# Altium footprint library TarabusLib_KOR.PcbLib: 560 footprints (part 3 of 35)
Each footprint in its own frame and in the unit in brackets; x right, y up, seen from the top. Pads: shape width x height; smd on the part's side, far side on the other; paste and mask are expansions set on the pad; w line width, h text height; cw(c..) or ccw(c..) is an arc to the next point about the centre after c.
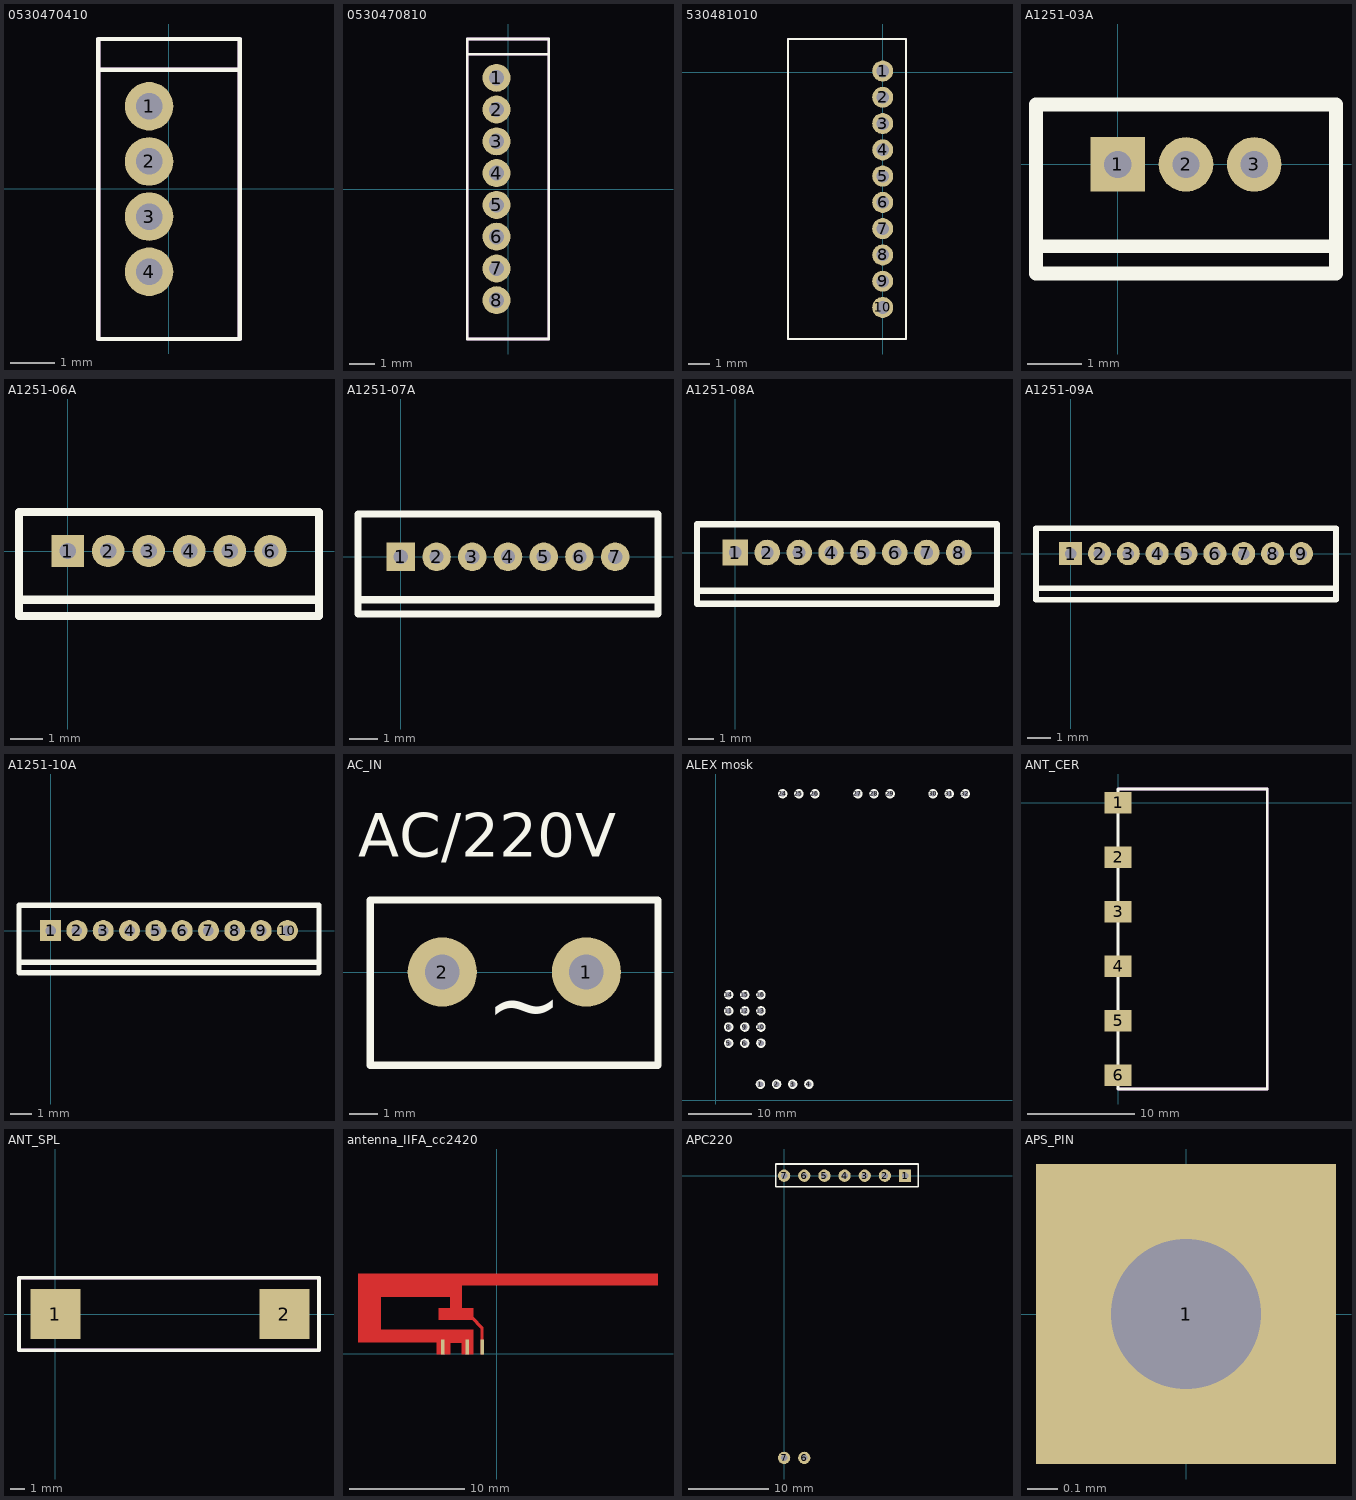
[diagram p2: the footprints below, top view; thin cyan lines are the x and y axes]

## 0530470410 [mm]
pads (4):
  round 1.1 hole 0.6 mask+0: 1(-0.45,1.875) 2(-0.45,0.625) 3(-0.45,-0.625) 4(-0.45,-1.875)
Top Overlay:
  lines w0.1: -1.6,2.7 1.6,2.7 ; -1.6,-3.4 1.6,-3.4 1.6,3.4 -1.6,3.4 -1.6,-3.4
Mechanical 7:
  lines w0.1: -1.6,2.7 1.6,2.7 ; -1.6,-3.4 -1.6,3.4 1.6,3.4 1.6,-3.4 -1.6,-3.4
3D body "530470410.stp": height 4.1, standoff -2.3, extent -1.6,-3.375 1.6,3.375

## 0530470810 [mm]
pads (8):
  round 1.1 hole 0.6 mask+0: 1(-0.45,4.375) 2(-0.45,3.125) 3(-0.45,1.875) 4(-0.45,0.625) 5(-0.45,-0.625) 6(-0.45,-1.875) 7(-0.45,-3.125) 8(-0.45,-4.375)
Top Overlay:
  lines w0.1: -1.6,5.3 1.6,5.3 ; -1.6,-5.9 1.6,-5.9 1.6,5.9 -1.6,5.9 -1.6,-5.9
Mechanical 7:
  lines w0.1: -1.6,5.3 1.6,5.3 ; -1.6,-5.9 -1.6,5.9 1.6,5.9 1.6,-5.9 -1.6,-5.9
3D body "530470810.stp": height 4.1, standoff -2.3, extent -1.6,-5.875 1.6,5.875

## 530481010 [mm]
pads (10):
  round 1 hole 0.6 mask+0: 1(0,0.05) 2(0,-1.2) 3(0,-2.45) 4(0,-3.7) 5(0,-4.95) 6(0,-6.2) 7(0,-7.45) 8(0,-8.7) 9(0,-9.95) 10(0,-11.2)
Top Overlay:
  lines w0.1: -4.5,-12.7 -4.5,1.575 1.1,1.575 1.1,-12.7 -4.5,-12.7
Mechanical 7:
  lines w0.1: -4.5,-12.7 1.1,-12.7 1.1,1.575 -4.5,1.575 -4.5,-12.7
3D body "5738.stp": height 3.55, standoff -2.25, extent -4.45,-12.625 1.05,1.625

## A1251-03A [mm]
pads (3):
  rect 1x1 hole 0.5 mask+0: 1(0,0)
  round 1 hole 0.5 mask+0: 2(1.25,0) 3(2.5,0)
Top Overlay:
  lines w0.254: -1.5,-1.5 4,-1.5 ; -1.5,-2 -1.5,1.1 4,1.1 4,-2 -1.5,-2
3D body "530470310.stp": height 4.1, standoff -2.3, extent -1.5,-2.1 4,1.1

## A1251-06A [mm]
pads (6):
  rect 1x1 hole 0.5 mask+0: 1(0,0)
  round 1 hole 0.5 mask+0: 2(1.25,0) 3(2.5,0) 4(3.75,0) 5(5,0) 6(6.25,0)
Top Overlay:
  lines w0.254: -1.5,-1.5 7.75,-1.5 ; -1.5,-2 -1.5,1.2 7.75,1.2 7.75,-2 -1.5,-2
3D body "530470610.stp": height 4.1, standoff -2.3, extent -1.425,-2.1 7.825,1.1

## A1251-07A [mm]
pads (7):
  rect 1x1 hole 0.5 mask+0: 1(0,0)
  round 1 hole 0.5 mask+0: 2(1.25,0) 3(2.5,0) 4(3.75,0) 5(5,0) 6(6.25,0) 7(7.5,0)
Top Overlay:
  lines w0.254: -1.5,-1.5 9,-1.5 ; -1.5,-2 -1.5,1.5 9,1.5 9,-2 -1.5,-2
3D body: height 8, standoff 0, extent -1.5,-2 9,1.5

## A1251-08A [mm]
pads (8):
  rect 1x1 hole 0.5 mask+0: 1(0,0)
  round 1 hole 0.5 mask+0: 2(1.25,0) 3(2.5,0) 4(3.75,0) 5(5,0) 6(6.25,0) 7(7.5,0) 8(8.75,0)
Top Overlay:
  lines w0.254: -1.5,-1.5 10.2,-1.5 ; -1.5,-2 10.25,-2 10.25,1.1 -1.5,1.1 -1.5,-2
3D body "530470810.stp": height 4.1, standoff -2.3, extent -1.475,-2.1 10.275,1.1

## A1251-09A [mm]
pads (9):
  rect 1x1 hole 0.5 mask+0: 1(0,0)
  round 1 hole 0.5 mask+0: 2(1.25,0) 3(2.5,0) 4(3.75,0) 5(5,0) 6(6.25,0) 7(7.5,0) 8(8.75,0) 9(10,0)
Top Overlay:
  lines w0.254: -1.5,-1.5 11.5,-1.5 ; -1.5,-2 11.5,-2 11.5,1.1 -1.5,1.1 -1.5,-2
3D body "530470910.stp": height 4.1, standoff -2.3, extent -1.45,-2.125 11.55,1.075

## A1251-10A [mm]
pads (10):
  rect 1x1 hole 0.5 mask+0: 1(0,0)
  round 1 hole 0.5 mask+0: 2(1.25,0) 3(2.5,0) 4(3.75,0) 5(5,0) 6(6.25,0) 7(7.5,0) 8(8.75,0) 9(10,0) 10(11.25,0)
Top Overlay:
  lines w0.254: -1.5,-1.5 12.75,-1.5 ; -1.5,-2 12.75,-2 12.75,1.2 -1.5,1.2 -1.5,-2
3D body "530471010.stp": height 4.1, standoff -2.3, extent -1.525,-2 12.725,1.2

## AC_IN [mm]
pads (2):
  round 2.4 hole 1.2: 1(-7.5,0) 2(-12.5,0)
Top Overlay:
  lines w0.254: -15,-3.233 -15,2.5 -5.014,2.5 -5.014,-3.233 -15,-3.233
  text "~" at -11,-3 h4
  text "AC/220V" at -15.425,4 h1.52

## ALEX mosk [mm]
pads (25):
  round 1.5 on Top Overlay hole 0.9 unplated mask+0.1: 1(7,2.54) 2(9.54,2.54) 3(12.08,2.54) 4(14.62,2.54) 5(2,9) 6(4.54,9) 7(7.08,9) 8(2,11.54) 9(4.54,11.54) 10(7.08,11.54) 11(2,14.08) 12(4.54,14.08) 13(7.08,14.08) 14(2,16.62) 15(4.54,16.62) 16(7.08,16.62) 24(10.5,48.25) 25(13.04,48.25) 26(15.58,48.25) 27(22.33,48.25) 28(24.87,48.25) 29(27.41,48.25) 30(34.16,48.25) 31(36.7,48.25) 32(39.24,48.25)
3D body "Контроллер2.STEP": height -0.95, standoff -11.75, extent -38,-1.5 50.4,51.6

## ANT_CER [mm]
pads (6):
  rect 2.5x2 smd: 1(0,0) 2(0,-5.1) 3(0,-10.2) 4(0,-15.3) 5(0,-20.4) 6(0,-25.5)
Top Overlay:
  lines w0.254: 0,-26.77 0,1.297 13.97,1.297 13.97,-26.77 0,-26.77
Mechanical 7:
  lines w0.254: 0,-26.77 13.97,-26.77 13.97,1.297 0,1.297

## ANT_SPL [mm]
pads (2):
  rect 3.5x3.5 smd: 1(0,0) 2(16,0)
Top Overlay:
  lines w0.254: -2.54,-2.54 -2.54,2.54 18.415,2.54 18.415,-2.54 -2.54,-2.54
Mechanical 7:
  lines w0.254: -2.54,-2.54 -2.54,2.54 18.415,2.54 18.415,-2.54 -2.54,-2.54

## antenna_IIFA_cc2420 [mm]
pads (3):
  rect 0.3x1.3 smd paste-0.3 mask-0.3: 1(-1.27,0.584) 2(-2.565,0.584) 3(-4.674,0.584)
Top Layer:
  region: -1.397,2.134 -1.422,2.21 -2.261,3.048 -2.032,3.175 -1.143,2.286 -1.143,2.134
  region: -1.143,-0.076 -1.397,-0.076 -1.397,2.147 -1.143,2.147
  region: -2.03,-0.076 -3.03,-0.076 -3.03,0.924 -4.03,0.924 -4.03,-0.076 -5.18,-0.076 -5.18,0.991 -12.012,0.991 -12.012,6.924 13.97,6.924 13.97,5.924 -3.03,5.924 -3.03,3.924 -2.03,3.924 -2.03,2.924 -5.03,2.924 -5.03,3.924 -4.03,3.924 -4.03,4.924 -10.03,4.924 -10.03,2.057 -2.03,2.057

## APC220 [mil]
pads (9):
  rect 60x60 hole 31.5: 1(590.55,0)
  round 60 hole 31.5: 2(492.13,0) 3(393.7,0) 4(295.28,0) 5(196.85,0) 6(98.43,-1377.95) 6(98.43,0) 7(0,-1377.95) 7(0,0)
Top Overlay:
  lines w7.87: -40.35,-53.15 654.53,-53.15 654.53,57.09 -40.35,57.09 -40.35,-53.15
Mechanical 9:
  text ".Comment" at 252.76,-216.34 h23.62
  text ".Designator" at 248.03,-190.75 h31.5
3D body "User Library-APC_220_1.STEP": height 2496.06, standoff -102.36, extent -45.28,-2311.03 637.32,51.18

## APS_PIN [mm]
pads (1):
  rect 1x1 hole 0.5 mask+0: 1(0,0)